# Altium schematic symbol library LATTICEPLDS_Library.SchLib: 291 symbols (part 4 of 32) (continued)
## LCMXO2-640-TG100 (continued)
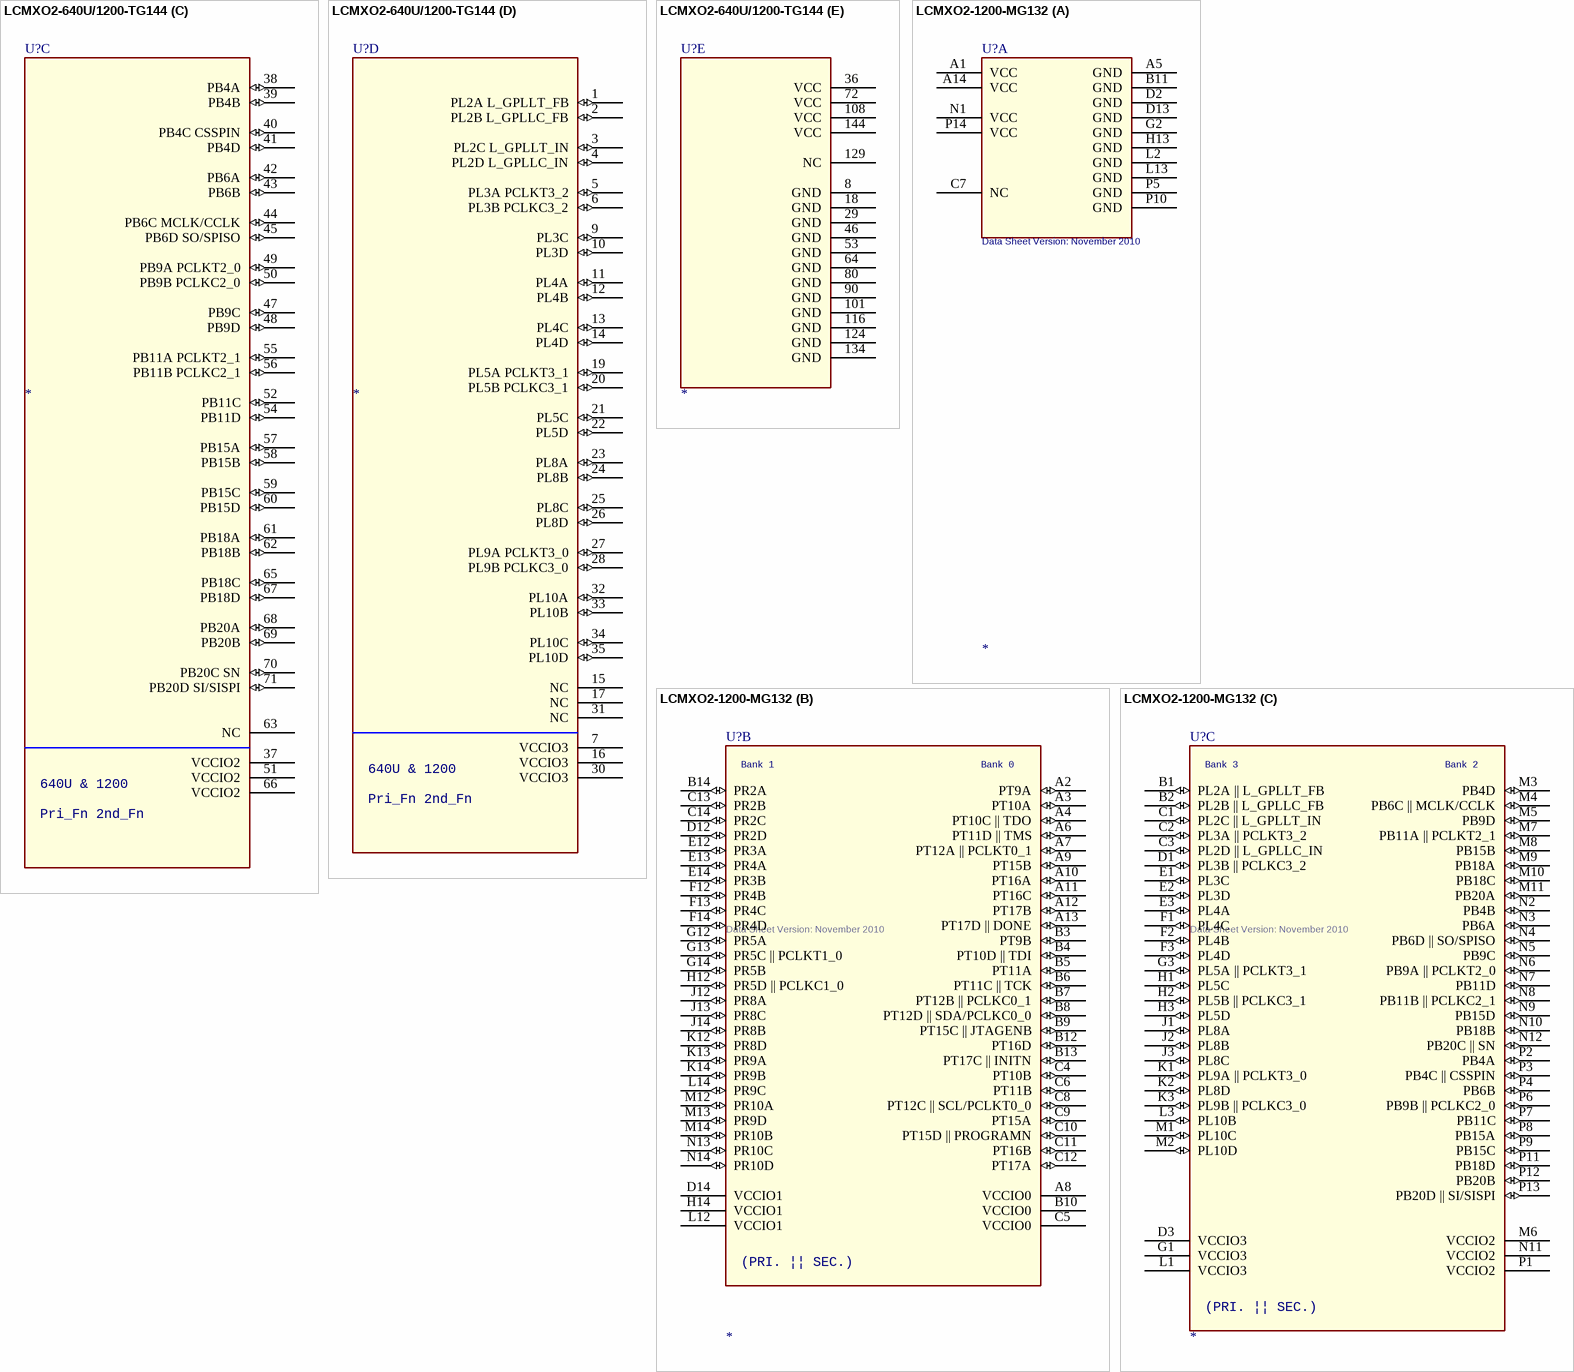
[diagram p38: symbols LCMXO2-640U/1200-TG144 to LCMXO2-1200-MG132]

## LCMXO2-640U/1200-TG144
designator U?
SPLIT_INST: TRUE; SWAP_INFO: (S1+S2+S3+S4+S5)
part A pins: 109 PT17D DONE (io), 110 PT17C INITN (io), 111 PT17B* (io), 112 PT17A* (io), 113 PT16D (io), 114 PT16C (io), 115 PT16B* (io), 117 PT16A* (io), 118 VCCIO0 (power), 119 PT15D PROGRAMN (io), 120 PT15C JTAGENB (io), 121 PT15B* (io), 122 PT15A* (io), 123 VCCIO0 (power), 125 PT12D SDA/PCLKC0_0 (io), 126 PT12C SCL/PCLKT0_0 (io), 127 PT12B* PCLKC0_1 (io), 128 PT12A* PCLKT0_1 (io), 130 PT11D TMS (io), 131 PT11C TCK (io), 132 PT11B* (io), 133 PT11A* (io), 135 VCCIO0 (power), 136 PT10D TDI (io), 137 PT10C TDO (io), 138 PT10B* (io), 139 PT10A* (io), 140 PT9D (io), 141 PT9C (io), 142 PT9B* (io), 143 PT9A* (io)
part B pins: 73 PR10D (io), 74 PR10C (io), 75 PR10B (io), 76 PR10A (io), 77 PR9D (io), 78 PR9C (io), 79 VCCIO1 (power), 81 PR9B (io), 82 PR9A (io), 83 PR8D (io), 84 PR8C (io), 85 PR8B DQS1N (io), 86 PR8A DQS1 (io), 87 NC, 88 VCCIO1 (power), 89 NC, 91 PR5D PCLKC1_0 (io), 92 PR5C PCLKT1_0 (io), 93 PR5B DQS0N (io), 94 PR5A DQS0 (io), 95 PR4D (io), 96 PR4C (io), 97 PR4B (io), 98 PR4A (io), 99 PR3B (io), 100 PR3A (io), 102 VCCIO1 (power), 103 NC, 104 PR2D (io), 105 PR2C (io), 106 PR2B (io), 107 PR2A (io)
part C pins: 37 VCCIO2 (power), 38 PB4A (io), 39 PB4B (io), 40 PB4C CSSPIN (io), 41 PB4D (io), 42 PB6A (io), 43 PB6B (io), 44 PB6C MCLK/CCLK (io), 45 PB6D SO/SPISO (io), 47 PB9C (io), 48 PB9D (io), 49 PB9A PCLKT2_0 (io), 50 PB9B PCLKC2_0 (io), 51 VCCIO2 (power), 52 PB11C (io), 54 PB11D (io), 55 PB11A PCLKT2_1 (io), 56 PB11B PCLKC2_1 (io), 57 PB15A (io), 58 PB15B (io), 59 PB15C (io), 60 PB15D (io), 61 PB18A (io), 62 PB18B (io), 63 NC, 65 PB18C (io), 66 VCCIO2 (power), 67 PB18D (io), 68 PB20A (io), 69 PB20B (io), 70 PB20C SN (io), 71 PB20D SI/SISPI (io)
part D pins: 1 PL2A L_GPLLT_FB (io), 2 PL2B L_GPLLC_FB (io), 3 PL2C L_GPLLT_IN (io), 4 PL2D L_GPLLC_IN (io), 5 PL3A PCLKT3_2 (io), 6 PL3B PCLKC3_2 (io), 7 VCCIO3 (power), 9 PL3C (io), 10 PL3D (io), 11 PL4A (io), 12 PL4B (io), 13 PL4C (io), 14 PL4D (io), 15 NC, 16 VCCIO3 (power), 17 NC, 19 PL5A PCLKT3_1 (io), 20 PL5B PCLKC3_1 (io), 21 PL5C (io), 22 PL5D (io), 23 PL8A (io), 24 PL8B (io), 25 PL8C (io), 26 PL8D (io), 27 PL9A PCLKT3_0 (io), 28 PL9B PCLKC3_0 (io), 30 VCCIO3 (power), 31 NC, 32 PL10A (io), 33 PL10B (io), 34 PL10C (io), 35 PL10D (io)
part E pins: 8 GND (power), 18 GND (power), 29 GND (power), 36 VCC (power), 46 GND (power), 53 GND (power), 64 GND (power), 72 VCC (power), 80 GND (power), 90 GND (power), 101 GND (power), 108 VCC (power), 116 GND (power), 124 GND (power), 129 NC (power), 134 GND (power), 144 VCC (power)
part A text: 640U & 1200; Pri_Fn 2nd_Fn; *=True LVDS
part B text: DQ0; DQ1; 640U & 1200; Pri_Fn 2nd_Fn
part C text: 640U & 1200; Pri_Fn 2nd_Fn
part D text: 640U & 1200; Pri_Fn 2nd_Fn

## LCMXO2-1200-MG132
designator U?  Data Sheet Version: November 2010
SPLIT_INST: TRUE; SWAP_INFO: (S1+S2+S3)
part A pins: A1 VCC (power), A5 GND (power), A14 VCC (power), B11 GND (power), C7 NC, D2 GND (power), D13 GND (power), G2 GND (power), H13 GND (power), L2 GND (power), L13 GND (power), N1 VCC (power), P5 GND (power), P10 GND (power), P14 VCC (power)
part B pins: A2 PT9A (io), A3 PT10A (io), A4 PT10C || TDO (io), A6 PT11D || TMS (io), A7 PT12A || PCLKT0_1 (io), A8 VCCIO0 (power), A9 PT15B (io), A10 PT16A (io), A11 PT16C (io), A12 PT17B (io), A13 PT17D || DONE (io), B3 PT9B (io), B4 PT10D || TDI (io), B5 PT11A (io), B6 PT11C || TCK (io), B7 PT12B || PCLKC0_1 (io), B8 PT12D || SDA/PCLKC0_0 (io), B9 PT15C || JTAGENB (io), B10 VCCIO0 (power), B12 PT16D (io), B13 PT17C || INITN (io), B14 PR2A (io), C4 PT10B (io), C5 VCCIO0 (power), C6 PT11B (io), C8 PT12C || SCL/PCLKT0_0 (io), C9 PT15A (io), C10 PT15D || PROGRAMN (io), C11 PT16B (io), C12 PT17A (io), C13 PR2B (io), C14 PR2C (io), D12 PR2D (io), D14 VCCIO1 (power), E12 PR3A (io), E13 PR4A (io), E14 PR3B (io), F12 PR4B (io), F13 PR4C (io), F14 PR4D (io), G12 PR5A (io), G13 PR5C || PCLKT1_0 (io), G14 PR5B (io), H12 PR5D || PCLKC1_0 (io), H14 VCCIO1 (power), J12 PR8A (io), J13 PR8C (io), J14 PR8B (io), K12 PR8D (io), K13 PR9A (io), K14 PR9B (io), L12 VCCIO1 (power), L14 PR9C (io), M12 PR10A (io), M13 PR9D (io), M14 PR10B (io), N13 PR10C (io), N14 PR10D (io)
part C pins: B1 PL2A || L_GPLLT_FB (io), B2 PL2B || L_GPLLC_FB (io), C1 PL2C || L_GPLLT_IN (io), C2 PL3A || PCLKT3_2 (io), C3 PL2D || L_GPLLC_IN (io), D1 PL3B || PCLKC3_2 (io), D3 VCCIO3 (power), E1 PL3C (io), E2 PL3D (io), E3 PL4A (io), F1 PL4C (io), F2 PL4B (io), F3 PL4D (io), G1 VCCIO3 (power), G3 PL5A || PCLKT3_1 (io), H1 PL5C (io), H2 PL5B || PCLKC3_1 (io), H3 PL5D (io), J1 PL8A (io), J2 PL8B (io), J3 PL8C (io), K1 PL9A || PCLKT3_0 (io), K2 PL8D (io), K3 PL9B || PCLKC3_0 (io), L1 VCCIO3 (power), L3 PL10B (io), M1 PL10C (io), M2 PL10D (io), M3 PB4D (io), M4 PB6C || MCLK/CCLK (io), M5 PB9D (io), M6 VCCIO2 (power), M7 PB11A || PCLKT2_1 (io), M8 PB15B (io), M9 PB18A (io), M10 PB18C (io), M11 PB20A (io), N2 PB4B (io), N3 PB6A (io), N4 PB6D || SO/SPISO (io), N5 PB9C (io), N6 PB9A || PCLKT2_0 (io), N7 PB11D (io), N8 PB11B || PCLKC2_1 (io), N9 PB15D (io), N10 PB18B (io), N11 VCCIO2 (power), N12 PB20C || SN (io), P1 VCCIO2 (power), P2 PB4A (io), P3 PB4C || CSSPIN (io), P4 PB6B (io), P6 PB9B || PCLKC2_0 (io), P7 PB11C (io), P8 PB15A (io), P9 PB15C (io), P11 PB18D (io), P12 PB20B (io), P13 PB20D || SI/SISPI (io)
part B text: Bank 1; Bank 0; (PRI. || SEC.)
part C text: Bank 3; Bank 2; (PRI. || SEC.)

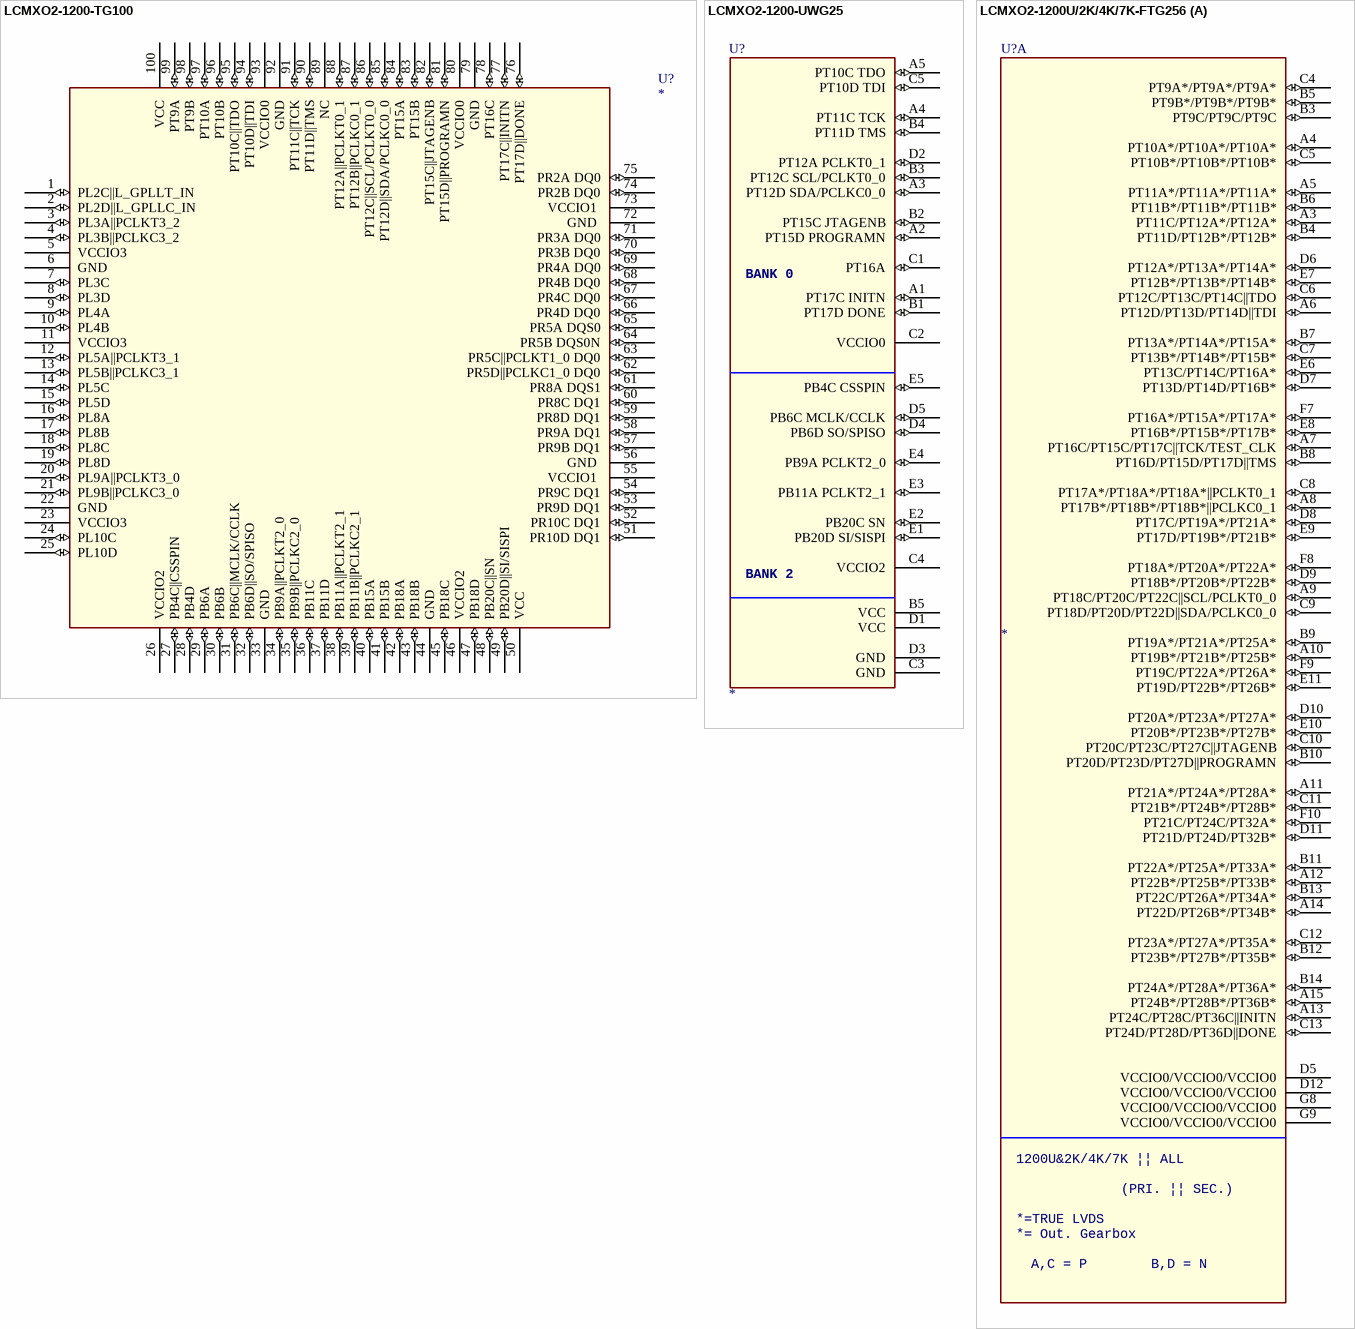
[diagram p39: symbols LCMXO2-1200-TG100 to LCMXO2-1200U/2K/4K/7K-FTG256]

## LCMXO2-1200-TG100
designator U?
Data Sheet Version: November 2010
pins: 1 PL2C||L_GPLLT_IN  (io), 2 PL2D||L_GPLLC_IN  (io), 3 PL3A||PCLKT3_2  (io), 4 PL3B||PCLKC3_2  (io), 5 VCCIO3  (power), 6 GND  (power), 7 PL3C  (io), 8 PL3D  (io), 9 PL4A  (io), 10 PL4B  (io), 11 VCCIO3  (power), 12 PL5A||PCLKT3_1  (io), 13 PL5B||PCLKC3_1  (io), 14 PL5C  (io), 15 PL5D  (io), 16 PL8A  (io), 17 PL8B  (io), 18 PL8C  (io), 19 PL8D  (io), 20 PL9A||PCLKT3_0  (io), 21 PL9B||PCLKC3_0  (io), 22 GND  (power), 23 VCCIO3  (power), 24 PL10C  (io), 25 PL10D  (io), 26 VCCIO2  (power), 27 PB4C||CSSPIN  (io), 28 PB4D  (io), 29 PB6A  (io), 30 PB6B  (io), 31 PB6C||MCLK/CCLK  (io), 32 PB6D||SO/SPISO  (io), 33 GND  (power), 34 PB9A||PCLKT2_0  (io), 35 PB9B||PCLKC2_0  (io), 36 PB11C  (io), 37 PB11D  (io), 38 PB11A||PCLKT2_1  (io), 39 PB11B||PCLKC2_1  (io), 40 PB15A  (io), 41 PB15B  (io), 42 PB18A  (io), 43 PB18B  (io), 44 GND  (power), 45 PB18C  (io), 46 VCCIO2  (power), 47 PB18D  (io), 48 PB20C||SN  (io), 49 PB20D||SI/SISPI  (io), 50 VCC  (power), 51 PR10D DQ1 (io), 52 PR10C DQ1 (io), 53 PR9D DQ1 (io), 54 PR9C DQ1 (io), 55 VCCIO1  (power), 56 GND  (power), 57 PR9B DQ1 (io), 58 PR9A DQ1 (io), 59 PR8D DQ1 (io), 60 PR8C DQ1 (io), 61 PR8A DQS1 (io), 62 PR5D||PCLKC1_0 DQ0 (io), 63 PR5C||PCLKT1_0 DQ0 (io), 64 PR5B DQS0N (io), 65 PR5A DQS0 (io), 66 PR4D DQ0 (io), 67 PR4C DQ0 (io), 68 PR4B DQ0 (io), 69 PR4A DQ0 (io), 70 PR3B DQ0 (io), 71 PR3A DQ0 (io), 72 GND  (power), 73 VCCIO1  (power), 74 PR2B DQ0 (io), 75 PR2A DQ0 (io), 76 PT17D||DONE  (io), 77 PT17C||INITN  (io), 78 PT16C  (io), 79 GND  (power), 80 VCCIO0  (power), 81 PT15D||PROGRAMN  (io), 82 PT15C||JTAGENB  (io), 83 PT15B  (io), 84 PT15A  (io), 85 PT12D||SDA/PCLKC0_0  (io), 86 PT12C||SCL/PCLKT0_0  (io), 87 PT12B||PCLKC0_1  (io), 88 PT12A||PCLKT0_1  (io), 89 NC , 90 PT11D||TMS  (io), 91 PT11C||TCK  (io), 92 GND  (power), 93 VCCIO0  (power), 94 PT10D||TDI  (io), 95 PT10C||TDO  (io), 96 PT10B  (io), 97 PT10A  (io), 98 PT9B  (io), 99 PT9A  (io), 100 VCC  (power)

## LCMXO2-1200-UWG25
designator U?
pins: A1 PT17C INITN (io), A2 PT15D PROGRAMN (io), A3 PT12D SDA/PCLKC0_0 (io), A4 PT11C TCK (io), A5 PT10C TDO (io), B1 PT17D DONE (io), B2 PT15C JTAGENB (io), B3 PT12C SCL/PCLKT0_0 (io), B4 PT11D TMS (io), B5 VCC (power), C1 PT16A (io), C2 VCCIO0 (power), C3 GND (power), C4 VCCIO2 (power), C5 PT10D TDI (io), D1 VCC (power), D2 PT12A PCLKT0_1 (io), D3 GND (power), D4 PB6D SO/SPISO (io), D5 PB6C MCLK/CCLK (io), E1 PB20D SI/SISPI (io), E2 PB20C SN (io), E3 PB11A PCLKT2_1 (io), E4 PB9A PCLKT2_0 (io), E5 PB4C CSSPIN (io)
text: BANK 0; BANK 2

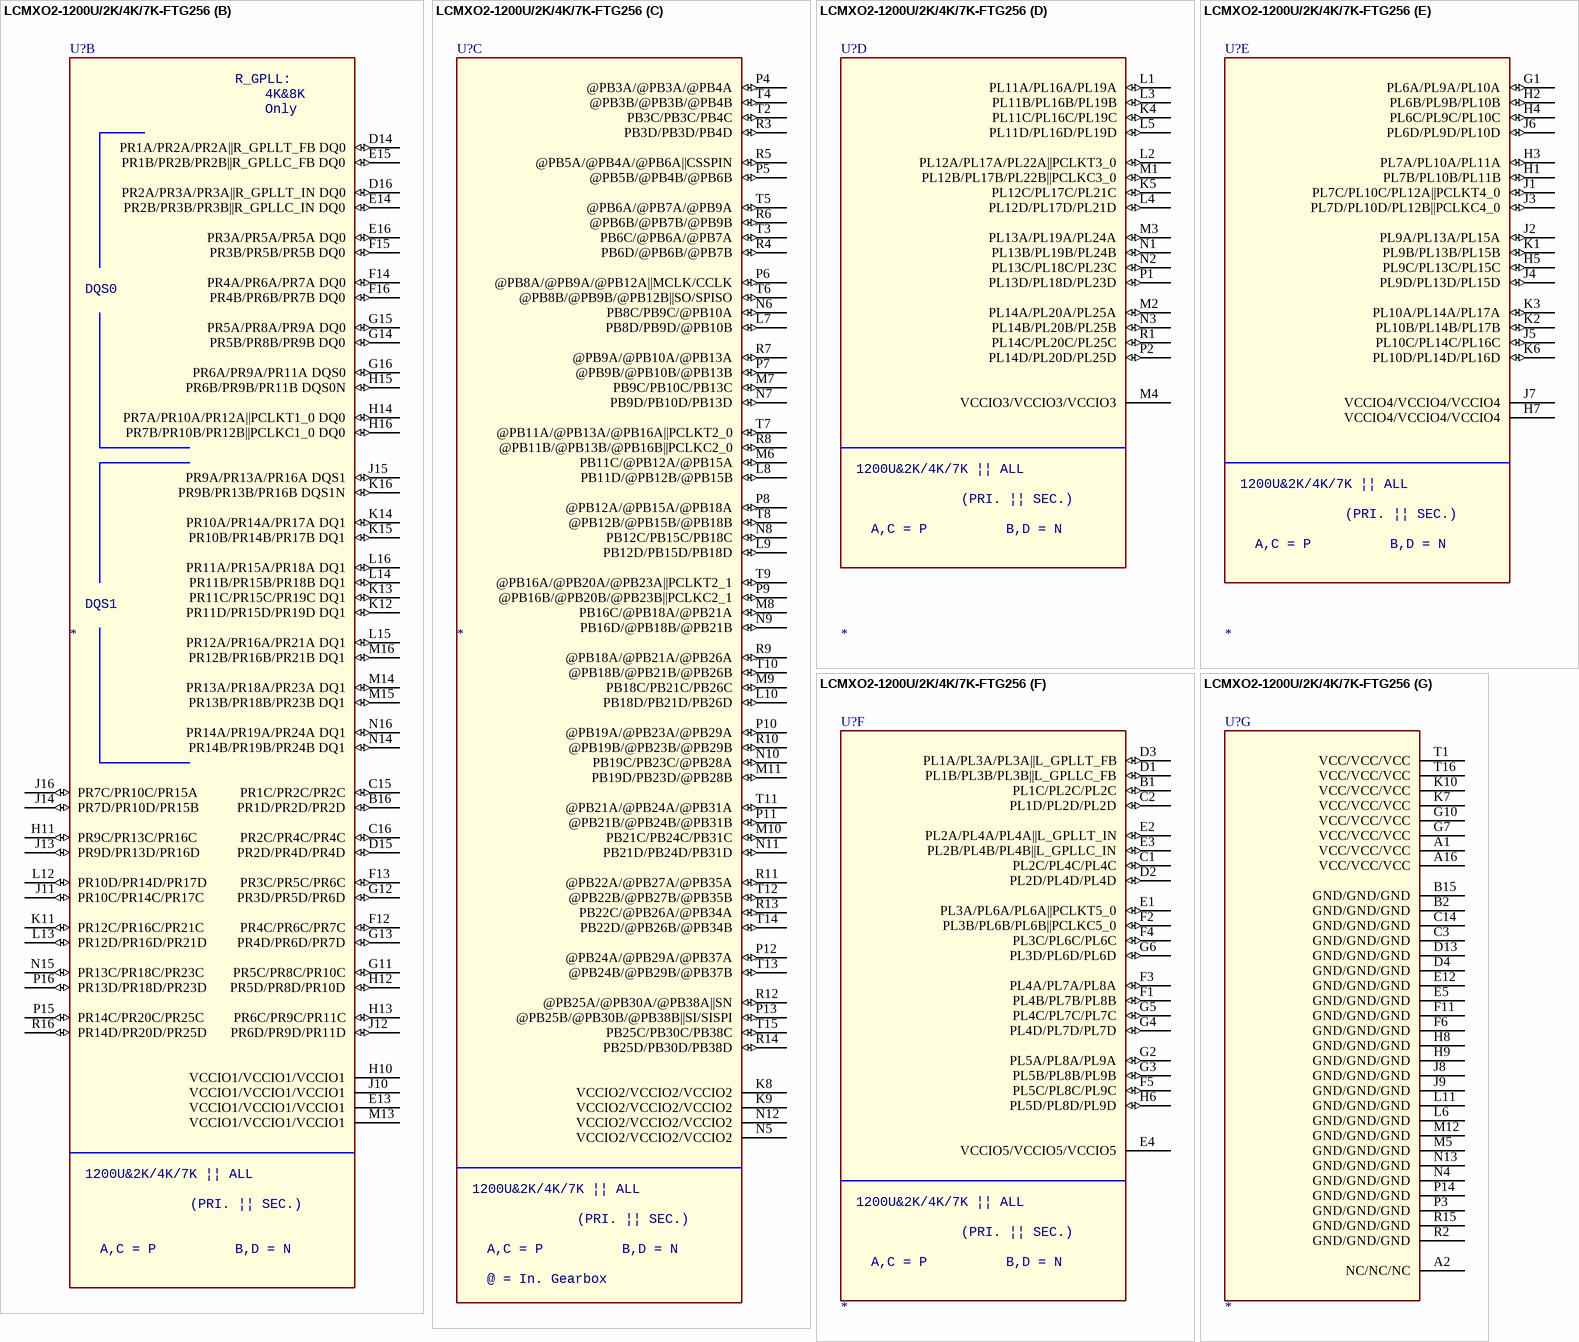
[diagram p40: symbol LCMXO2-1200U/2K/4K/7K-FTG256]

## LCMXO2-1200U/2K/4K/7K-FTG256
designator U?
SPLIT_INST: TRUE; SWAP_INFO: (S1+S2+S3+S4+S5+S6+S7)
part A pins: A3 PT11C/PT12A*/PT12A* (io), A4 PT10A*/PT10A*/PT10A* (io), A5 PT11A*/PT11A*/PT11A* (io), A6 PT12D/PT13D/PT14D||TDI (io), A7 PT16C/PT15C/PT17C||TCK/TEST_CLK (io), A8 PT17B*/PT18B*/PT18B*||PCLKC0_1 (io), A9 PT18C/PT20C/PT22C||SCL/PCLKT0_0 (io), A10 PT19B*/PT21B*/PT25B* (io), A11 PT21A*/PT24A*/PT28A* (io), A12 PT22B*/PT25B*/PT33B* (io), A13 PT24C/PT28C/PT36C||INITN (io), A14 PT22D/PT26B*/PT34B* (io), A15 PT24B*/PT28B*/PT36B* (io), B3 PT9C/PT9C/PT9C (io), B4 PT11D/PT12B*/PT12B* (io), B5 PT9B*/PT9B*/PT9B* (io), B6 PT11B*/PT11B*/PT11B* (io), B7 PT13A*/PT14A*/PT15A* (io), B8 PT16D/PT15D/PT17D||TMS (io), B9 PT19A*/PT21A*/PT25A* (io), B10 PT20D/PT23D/PT27D||PROGRAMN (io), B11 PT22A*/PT25A*/PT33A* (io), B12 PT23B*/PT27B*/PT35B* (io), B13 PT22C/PT26A*/PT34A* (io), B14 PT24A*/PT28A*/PT36A* (io), C4 PT9A*/PT9A*/PT9A* (io), C5 PT10B*/PT10B*/PT10B* (io), C6 PT12C/PT13C/PT14C||TDO (io), C7 PT13B*/PT14B*/PT15B* (io), C8 PT17A*/PT18A*/PT18A*||PCLKT0_1 (io), C9 PT18D/PT20D/PT22D||SDA/PCLKC0_0 (io), C10 PT20C/PT23C/PT27C||JTAGENB (io), C11 PT21B*/PT24B*/PT28B* (io), C12 PT23A*/PT27A*/PT35A* (io), C13 PT24D/PT28D/PT36D||DONE (io), D5 VCCIO0/VCCIO0/VCCIO0 (power), D6 PT12A*/PT13A*/PT14A* (io), D7 PT13D/PT14D/PT16B* (io), D8 PT17C/PT19A*/PT21A* (io), D9 PT18B*/PT20B*/PT22B* (io), D10 PT20A*/PT23A*/PT27A* (io), D11 PT21D/PT24D/PT32B* (io), D12 VCCIO0/VCCIO0/VCCIO0 (power), E6 PT13C/PT14C/PT16A* (io), E7 PT12B*/PT13B*/PT14B* (io), E8 PT16B*/PT15B*/PT17B* (io), E9 PT17D/PT19B*/PT21B* (io), E10 PT20B*/PT23B*/PT27B* (io), E11 PT19D/PT22B*/PT26B* (io), F7 PT16A*/PT15A*/PT17A* (io), F8 PT18A*/PT20A*/PT22A* (io), F9 PT19C/PT22A*/PT26A* (io), F10 PT21C/PT24C/PT32A* (io), G8 VCCIO0/VCCIO0/VCCIO0 (power), G9 VCCIO0/VCCIO0/VCCIO0 (power)
part B pins: B16 PR1D/PR2D/PR2D (io), C15 PR1C/PR2C/PR2C (io), C16 PR2C/PR4C/PR4C (io), D14 PR1A/PR2A/PR2A||R_GPLLT_FB DQ0 (io), D15 PR2D/PR4D/PR4D (io), D16 PR2A/PR3A/PR3A||R_GPLLT_IN DQ0 (io), E13 VCCIO1/VCCIO1/VCCIO1 (power), E14 PR2B/PR3B/PR3B||R_GPLLC_IN DQ0 (io), E15 PR1B/PR2B/PR2B||R_GPLLC_FB DQ0 (io), E16 PR3A/PR5A/PR5A DQ0 (io), F12 PR4C/PR6C/PR7C (io), F13 PR3C/PR5C/PR6C (io), F14 PR4A/PR6A/PR7A DQ0 (io), F15 PR3B/PR5B/PR5B DQ0 (io), F16 PR4B/PR6B/PR7B DQ0 (io), G11 PR5C/PR8C/PR10C (io), G12 PR3D/PR5D/PR6D (io), G13 PR4D/PR6D/PR7D (io), G14 PR5B/PR8B/PR9B DQ0 (io), G15 PR5A/PR8A/PR9A DQ0 (io), G16 PR6A/PR9A/PR11A DQS0 (io), H10 VCCIO1/VCCIO1/VCCIO1 (power), H11 PR9C/PR13C/PR16C (io), H12 PR5D/PR8D/PR10D (io), H13 PR6C/PR9C/PR11C (io), H14 PR7A/PR10A/PR12A||PCLKT1_0 DQ0 (io), H15 PR6B/PR9B/PR11B DQS0N (io), H16 PR7B/PR10B/PR12B||PCLKC1_0 DQ0 (io), J10 VCCIO1/VCCIO1/VCCIO1 (power), J11 PR10C/PR14C/PR17C (io), J12 PR6D/PR9D/PR11D (io), J13 PR9D/PR13D/PR16D (io), J14 PR7D/PR10D/PR15B (io), J15 PR9A/PR13A/PR16A DQS1 (io), J16 PR7C/PR10C/PR15A (io), K11 PR12C/PR16C/PR21C (io), K12 PR11D/PR15D/PR19D DQ1 (io), K13 PR11C/PR15C/PR19C DQ1 (io), K14 PR10A/PR14A/PR17A DQ1 (io), K15 PR10B/PR14B/PR17B DQ1 (io), K16 PR9B/PR13B/PR16B DQS1N (io), L12 PR10D/PR14D/PR17D (io), L13 PR12D/PR16D/PR21D (io), L14 PR11B/PR15B/PR18B DQ1 (io), L15 PR12A/PR16A/PR21A DQ1 (io), L16 PR11A/PR15A/PR18A DQ1 (io), M13 VCCIO1/VCCIO1/VCCIO1 (power), M14 PR13A/PR18A/PR23A DQ1 (io), M15 PR13B/PR18B/PR23B DQ1 (io), M16 PR12B/PR16B/PR21B DQ1 (io), N14 PR14B/PR19B/PR24B DQ1 (io), N15 PR13C/PR18C/PR23C (io), N16 PR14A/PR19A/PR24A DQ1 (io), P15 PR14C/PR20C/PR25C (io), P16 PR13D/PR18D/PR23D (io), R16 PR14D/PR20D/PR25D (io)
part C pins: K8 VCCIO2/VCCIO2/VCCIO2 (power), K9 VCCIO2/VCCIO2/VCCIO2 (power), L7 PB8D/PB9D/@PB10B (io), L8 PB11D/@PB12B/@PB15B (io), L9 PB12D/PB15D/PB18D (io), L10 PB18D/PB21D/PB26D (io), M6 PB11C/@PB12A/@PB15A (io), M7 PB9C/PB10C/PB13C (io), M8 PB16C/@PB18A/@PB21A (io), M9 PB18C/PB21C/PB26C (io), M10 PB21C/PB24C/PB31C (io), M11 PB19D/PB23D/@PB28B (io), N5 VCCIO2/VCCIO2/VCCIO2 (power), N6 PB8C/PB9C/@PB10A (io), N7 PB9D/PB10D/PB13D (io), N8 PB12C/PB15C/PB18C (io), N9 PB16D/@PB18B/@PB21B (io), N10 PB19C/PB23C/@PB28A (io), N11 PB21D/PB24D/PB31D (io), N12 VCCIO2/VCCIO2/VCCIO2 (power), P4 @PB3A/@PB3A/@PB4A (io), P5 @PB5B/@PB4B/@PB6B (io), P6 @PB8A/@PB9A/@PB12A||MCLK/CCLK (io), P7 @PB9B/@PB10B/@PB13B (io), P8 @PB12A/@PB15A/@PB18A (io), P9 @PB16B/@PB20B/@PB23B||PCLKC2_1 (io), P10 @PB19A/@PB23A/@PB29A (io), P11 @PB21B/@PB24B/@PB31B (io), P12 @PB24A/@PB29A/@PB37A (io), P13 @PB25B/@PB30B/@PB38B||SI/SISPI (io), R3 PB3D/PB3D/PB4D (io), R4 PB6D/@PB6B/@PB7B (io), R5 @PB5A/@PB4A/@PB6A||CSSPIN (io), R6 @PB6B/@PB7B/@PB9B (io), R7 @PB9A/@PB10A/@PB13A (io), R8 @PB11B/@PB13B/@PB16B||PCLKC2_0 (io), R9 @PB18A/@PB21A/@PB26A (io), R10 @PB19B/@PB23B/@PB29B (io), R11 @PB22A/@PB27A/@PB35A (io), R12 @PB25A/@PB30A/@PB38A||SN (io), R13 PB22C/@PB26A/@PB34A (io), R14 PB25D/PB30D/PB38D (io), T2 PB3C/PB3C/PB4C (io), T3 PB6C/@PB6A/@PB7A (io), T4 @PB3B/@PB3B/@PB4B (io), T5 @PB6A/@PB7A/@PB9A (io), T6 @PB8B/@PB9B/@PB12B||SO/SPISO (io), T7 @PB11A/@PB13A/@PB16A||PCLKT2_0 (io), T8 @PB12B/@PB15B/@PB18B (io), T9 @PB16A/@PB20A/@PB23A||PCLKT2_1 (io), T10 @PB18B/@PB21B/@PB26B (io), T11 @PB21A/@PB24A/@PB31A (io), T12 @PB22B/@PB27B/@PB35B (io), T13 @PB24B/@PB29B/@PB37B (io), T14 PB22D/@PB26B/@PB34B (io), T15 PB25C/PB30C/PB38C (io)
part D pins: K4 PL11C/PL16C/PL19C (io), K5 PL12C/PL17C/PL21C (io), L1 PL11A/PL16A/PL19A (io), L2 PL12A/PL17A/PL22A||PCLKT3_0 (io), L3 PL11B/PL16B/PL19B (io), L4 PL12D/PL17D/PL21D (io), L5 PL11D/PL16D/PL19D (io), M1 PL12B/PL17B/PL22B||PCLKC3_0 (io), M2 PL14A/PL20A/PL25A (io), M3 PL13A/PL19A/PL24A (io), M4 VCCIO3/VCCIO3/VCCIO3 (power), N1 PL13B/PL19B/PL24B (io), N2 PL13C/PL18C/PL23C (io), N3 PL14B/PL20B/PL25B (io), P1 PL13D/PL18D/PL23D (io), P2 PL14D/PL20D/PL25D (io), R1 PL14C/PL20C/PL25C (io)
part E pins: G1 PL6A/PL9A/PL10A (io), H1 PL7B/PL10B/PL11B (io), H2 PL6B/PL9B/PL10B (io), H3 PL7A/PL10A/PL11A (io), H4 PL6C/PL9C/PL10C (io), H5 PL9C/PL13C/PL15C (io), H7 VCCIO4/VCCIO4/VCCIO4 (power), J1 PL7C/PL10C/PL12A||PCLKT4_0 (io), J2 PL9A/PL13A/PL15A (io), J3 PL7D/PL10D/PL12B||PCLKC4_0 (io), J4 PL9D/PL13D/PL15D (io), J5 PL10C/PL14C/PL16C (io), J6 PL6D/PL9D/PL10D (io), J7 VCCIO4/VCCIO4/VCCIO4 (power), K1 PL9B/PL13B/PL15B (io), K2 PL10B/PL14B/PL17B (io), K3 PL10A/PL14A/PL17A (io), K6 PL10D/PL14D/PL16D (io)
part F pins: B1 PL1C/PL2C/PL2C (io), C1 PL2C/PL4C/PL4C (io), C2 PL1D/PL2D/PL2D (io), D1 PL1B/PL3B/PL3B||L_GPLLC_FB (io), D2 PL2D/PL4D/PL4D (io), D3 PL1A/PL3A/PL3A||L_GPLLT_FB (io), E1 PL3A/PL6A/PL6A||PCLKT5_0 (io), E2 PL2A/PL4A/PL4A||L_GPLLT_IN (io), E3 PL2B/PL4B/PL4B||L_GPLLC_IN (io), E4 VCCIO5/VCCIO5/VCCIO5 (power), F1 PL4B/PL7B/PL8B (io), F2 PL3B/PL6B/PL6B||PCLKC5_0 (io), F3 PL4A/PL7A/PL8A (io), F4 PL3C/PL6C/PL6C (io), F5 PL5C/PL8C/PL9C (io), G2 PL5A/PL8A/PL9A (io), G3 PL5B/PL8B/PL9B (io), G4 PL4D/PL7D/PL7D (io), G5 PL4C/PL7C/PL7C (io), G6 PL3D/PL6D/PL6D (io), H6 PL5D/PL8D/PL9D (io)
part G pins: A1 VCC/VCC/VCC (power), A2 NC/NC/NC, A16 VCC/VCC/VCC (power), B2 GND/GND/GND (power), B15 GND/GND/GND (power), C3 GND/GND/GND (power), C14 GND/GND/GND (power), D4 GND/GND/GND (power), D13 GND/GND/GND (power), E5 GND/GND/GND (power), E12 GND/GND/GND (power), F6 GND/GND/GND (power), F11 GND/GND/GND (power), G7 VCC/VCC/VCC (power), G10 VCC/VCC/VCC (power), H8 GND/GND/GND (power), H9 GND/GND/GND (power), J8 GND/GND/GND (power), J9 GND/GND/GND (power), K7 VCC/VCC/VCC (power), K10 VCC/VCC/VCC (power), L6 GND/GND/GND (power), L11 GND/GND/GND (power), M5 GND/GND/GND (power), M12 GND/GND/GND (power), N4 GND/GND/GND (power), N13 GND/GND/GND (power), P3 GND/GND/GND (power), P14 GND/GND/GND (power), R2 GND/GND/GND (power), R15 GND/GND/GND (power), T1 VCC/VCC/VCC (power), T16 VCC/VCC/VCC (power)
